# Altium footprint library TeCrea-Misc.PCBLIB: 105 footprints (part 2 of 7)
Each footprint in its own frame and in the unit in brackets; x right, y up, seen from the top. Pads: shape width x height; smd on the part's side, far side on the other; paste and mask are expansions set on the pad; w line width, h text height; cw(c..) or ccw(c..) is an arc to the next point about the centre after c.
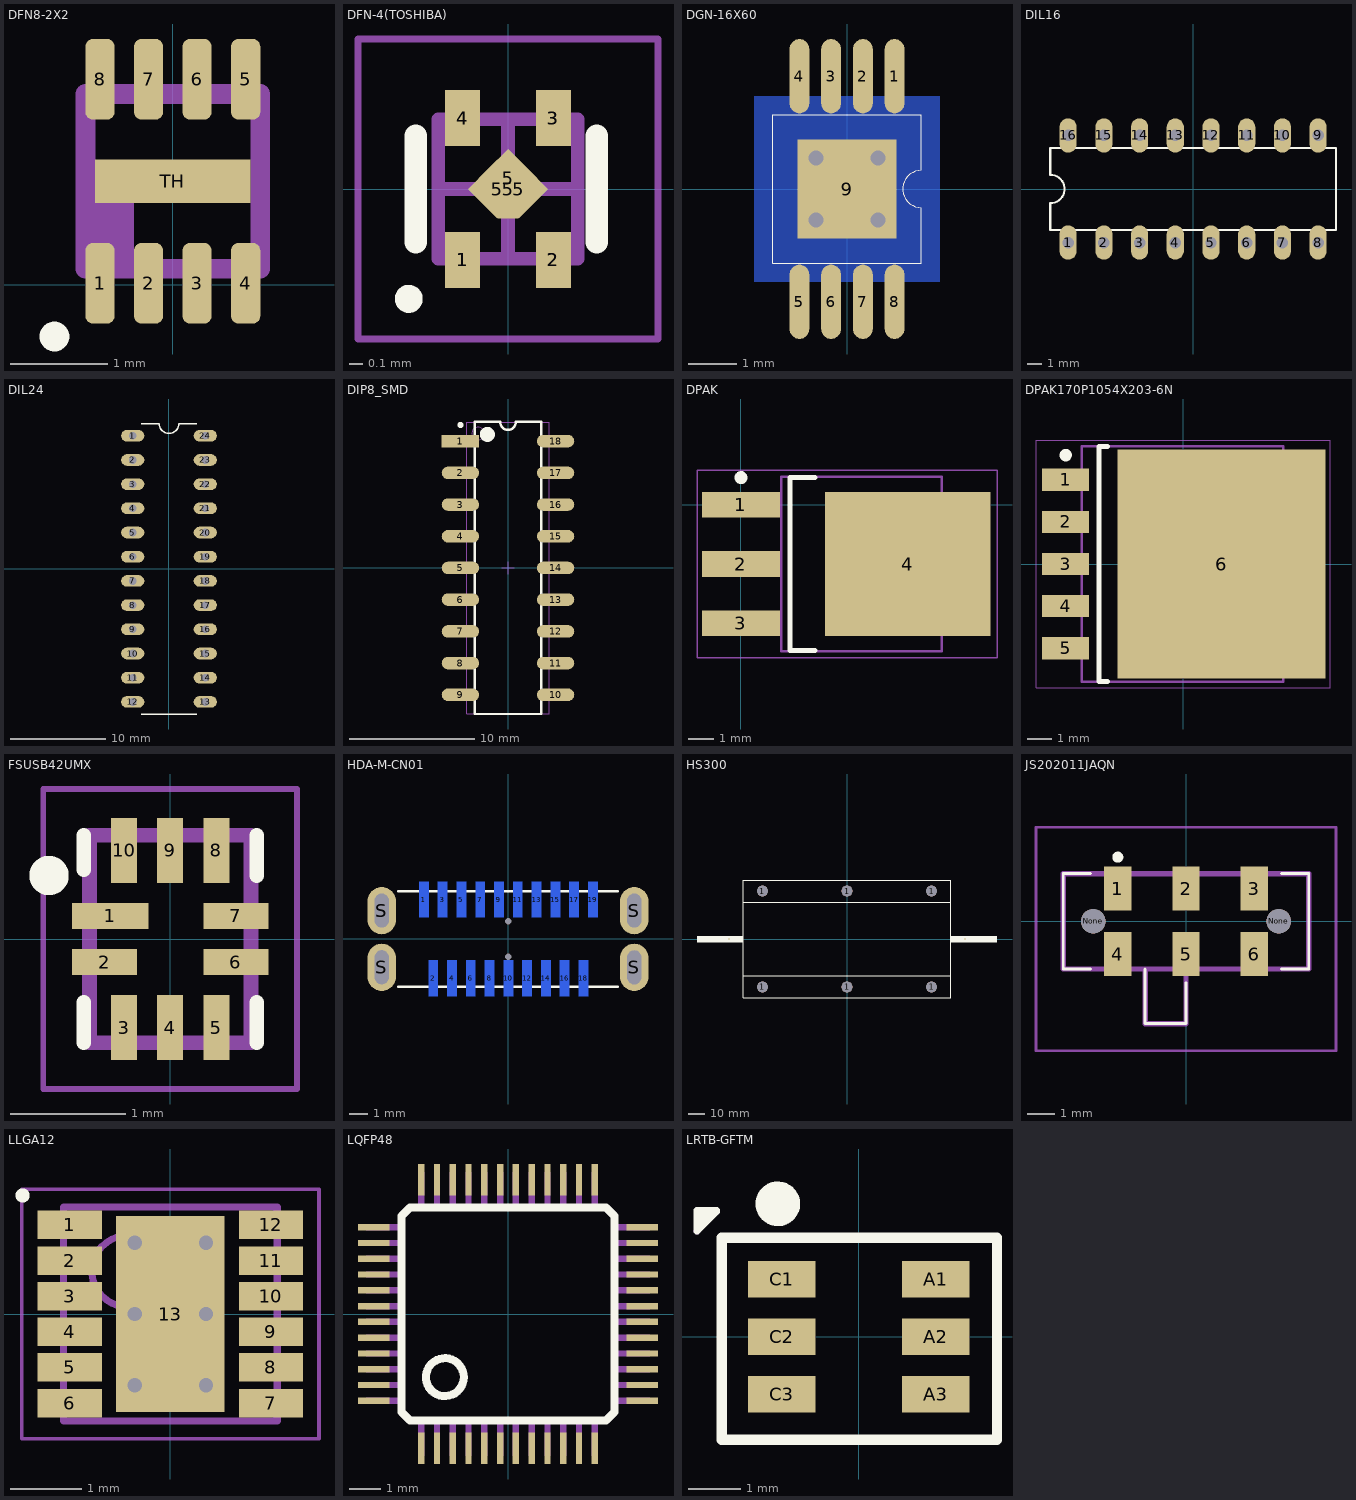
[diagram p1: the footprints below, top view; thin cyan lines are the x and y axes]

## DFN8-2X2 [mm]
pads (9):
  rrect50% 0.3x0.83 smd: 1(-0.75,0.015) 2(-0.25,0.015) 3(0.25,0.015) 4(0.75,0.015) 5(0.75,2.115) 6(0.25,2.115) 7(-0.25,2.115) 8(-0.75,2.115)
  rect 1.6x0.45 smd: TH(0,1.065)
Top Overlay:
  circle w0.254: c-1.219,-0.533 r0.025
Mechanical 16:
  rectangle: -0.85,0.265 -0.4,0.915
  lines w0.203: -0.9,0.165 0.9,0.165 0.9,1.965 -0.9,1.965 -0.9,0.165
3D body: height 0.6, standoff 0, extent -1,0.074 1,2.076
3D body: height 0.15, standoff 0, extent -0.875,0.05 -0.625,0.075
3D body: height 0.15, standoff 0, extent -0.375,0.05 -0.125,0.075
3D body: height 0.15, standoff 0, extent 0.125,0.05 0.375,0.075
3D body: height 0.15, standoff 0, extent 0.625,0.05 0.875,0.075
3D body: height 0.15, standoff 0, extent 0.625,2.075 0.875,2.1
3D body: height 0.15, standoff 0, extent 0.125,2.075 0.375,2.1
3D body: height 0.15, standoff 0, extent -0.375,2.075 -0.125,2.1
3D body: height 0.15, standoff 0, extent -0.875,2.075 -0.625,2.1
3D body: height 0.61, standoff 0, extent -0.774,0.35 -0.575,0.55

## DFN-4(TOSHIBA) [mm] "DFN4 1x1"
pads (12):
  oct 0.25x0.4 smd: 1(-0.325,-0.508) 2(0.325,-0.508) 3(0.325,0.508) 4(-0.325,0.508)
  rect 0.25x0.4 smd: 1(-0.325,-0.508) 2(0.325,-0.508) 3(0.325,0.508) 4(-0.325,0.508)
  rect 0.3x0.3 smd rot 45: 5(-0.076,0) 5(0,0.076) 5(0.076,0)
  oct 0.4x0.4 smd rot 45: 5(0,0)
Top Overlay:
  circle w0.1: c-0.711,-0.787 r0.05
  lines w0.16: -0.661,-0.381 -0.661,0.381 ; 0.635,-0.381 0.635,0.381
Courtyard Top:
  lines w0.05: -1.075,-1.075 -1.075,1.075 1.075,1.075 1.075,-1.075 -1.075,-1.075
  lines w0.1: -0.5,0 0.5,0 ; 0,-0.5 0,0.5
Assembly Top:
  lines w0.1: -0.5,-0.5 -0.5,0.5 0.5,0.5 0.5,-0.5 -0.5,-0.5
3D body "QFN65P100X100X58_HS-5N.step": height 0.58, standoff 0, extent -0.535,-0.5 0.535,0.5

## DGN-16X60 [mil] "DGN-16X60"
pads (9):
  oval 16x60 smd mask+2: 1(38.4,91) 2(12.8,91) 3(-12.8,91) 4(-38.4,91) 5(-38.4,-91) 6(-12.8,-91) 7(12.8,-91) 8(38.4,-91)
  rect 80x80 smd mask+2: 9(0,0)
via 25,-25 diameter 22 hole 12
via -25,-25 diameter 22 hole 12
via -25,25 diameter 22 hole 12
via 25,25 diameter 22 hole 12
Bottom Layer:
  region: 75,-75 75,75 -75,75 -75,-75
Top Overlay:
  lines w1: -60,-60 60,-60 60,-15 cw(c60,0) 60,15 60,60 -60,60 -60,-60
3D body "MSOP8.step": height 45.28, standoff 0, extent -59.06,-96.46 59.06,96.46

## DIL16 [mil]
pads (16):
  oval 48x96 hole 32: 1(-350,-150) 2(-250,-150) 3(-150,-150) 4(-50,-150) 5(50,-150) 6(150,-150) 7(250,-150) 8(350,-150) 9(350,150) 10(250,150) 11(150,150) 12(50,150) 13(-50,150) 14(-150,150) 15(-250,150) 16(-350,150)
Top Overlay:
  lines w6: -400,-115 -400,-40 ccw(c-400,0) -400,40 -400,115 400,115 400,-115 -400,-115
3D body "DIP16.step": height 200.79, standoff -129.92, extent -397.63,-155.91 389.77,153.94

## DIL24 [mil]
pads (24):
  oval 96x48 hole 32: 1(-150,550) 2(-150,450) 3(-150,350) 4(-150,250) 5(-150,150) 6(-150,50) 7(-150,-50) 8(-150,-150) 9(-150,-250) 10(-150,-350) 11(-150,-450) 12(-150,-550) 13(150,-550) 14(150,-450) 15(150,-350) 16(150,-250) 17(150,-150) 18(150,-50) 19(150,50) 20(150,150) 21(150,250) 22(150,350) 23(150,450) 24(150,550)
Top Overlay:
  lines w6: -115,-600 115,-600 ; -115,600 -40,600 ccw(c0,600) 40,600 115,600
3D body "DIP24-300.step": height 200, standoff -98.03, extent -154.92,-635.04 154.93,635.04

## DIP8_SMD [mm] "DIP8 SMD Mount"
pads (18):
  rect 3x1 smd: 1(-3.81,10.16)
  oval 3x1 smd: 2(-3.81,7.62) 3(-3.81,5.08) 4(-3.81,2.54) 5(-3.81,0) 6(-3.81,-2.54) 7(-3.81,-5.08) 8(-3.81,-7.62) 9(-3.81,-10.16) 10(3.81,-10.16) 11(3.81,-7.62) 12(3.81,-5.08) 13(3.81,-2.54) 14(3.81,0) 15(3.81,2.54) 16(3.81,5.08) 17(3.81,7.62) 18(3.81,10.16)
Top Overlay:
  circle w0.25: c-3.81,11.46 r0.125
  circle w0.6: c-1.65,10.7 r0.3
  lines w0.2: -2.65,-11.7 -2.65,11.7 -0.635,11.7 ccw(c0,11.7) 0.635,11.7 2.65,11.7 2.65,-11.7 -2.65,-11.7
Mechanical 13:
  circle w0.1: c-2.4,10.775 r0.5
  lines w0.1: -3.3,-11.675 -3.3,11.675 3.3,11.675 3.3,-11.675 -3.3,-11.675
Mechanical 15:
  lines w0.1: -0.5,0 0.5,0 ; 0,-0.5 0,0.5
3D body: height 5.34, standoff 0.38, extent -3.299,-11.674 3.299,11.674

## DPAK [mm]
height 2.38
pads (4):
  rect 3x1 smd: 1(0,0) 2(0,-2.29) 3(0,-4.58)
  rect 6.4x5.55 smd: 4(6.45,-2.29)
Top Overlay:
  circle w0.25: c0,1.05 r0.125
  lines w0.2: 2.85,-5.64 1.9,-5.64 1.9,1.06 2.85,1.06
Mechanical 13:
  lines w0.1: 1.55,-5.665 1.55,1.085 7.77,1.085 7.77,-5.665 1.55,-5.665
Mechanical 15:
  lines w0.05: -1.7,-5.915 -1.7,1.335 9.9,1.335 9.9,-5.915 -1.7,-5.915
  lines w0.1: 3.6,-2.29 4.6,-2.29 ; 4.1,-2.79 4.1,-1.79
3D body "DPAK.step": height 2.38, standoff 0, extent -0.5,-5.665 9.405,1.085

## DPAK170P1054X203-6N [mm] "S-PAK, 6-Pads, Body 7.17x8.12mm (max), IPC Medium Density"
height 2.03
pads (6):
  rect 1.9x0.9 smd: 1(-4.75,3.4) 2(-4.75,1.7) 3(-4.75,0) 4(-4.75,-1.7) 5(-4.75,-3.4)
  rect 8.4x9.25 smd: 6(1.55,0)
Top Overlay:
  circle w0.25: c-4.75,4.4 r0.125
  lines w0.2: -3.05,-4.75 -3.4,-4.75 -3.4,4.75 -3.05,4.75
Mechanical 13:
  lines w0.1: -4.1,-4.75 4.04,-4.75 4.04,4.75 -4.1,4.75 -4.1,-4.75
Mechanical 15:
  lines w0.05: -5.95,-5 5.95,-5 5.95,5 -5.95,5 -5.95,-5
  lines w0.1: -0.5,0 0.5,0 ; 0,-0.5 0,0.5
3D body "DPAK170P1054X203-6N.step": height 2.16, standoff 0, extent -4.965,-4.75 5.575,4.75

## ensayo qfn-BORRAR [mm]

## FSUSB42UMX [mm]
pads (10):
  rect 0.663x0.225 smd: 1(-0.519,0.2)
  rect 0.563x0.225 smd: 2(-0.569,-0.2) 6(0.569,-0.2) 7(0.569,0.2)
  rect 0.225x0.563 smd: 3(-0.4,-0.768) 4(0,-0.768) 5(0.4,-0.768) 8(0.4,0.768) 9(0,0.768) 10(-0.4,0.768)
Top Overlay:
  circle w0.2: c-1.05,0.55 r0.071
  lines w0.127: -0.75,-0.9 -0.75,-0.55 ; -0.75,0.6 -0.75,0.9 ; 0.75,-0.9 0.75,-0.55 ; 0.75,0.55 0.75,0.9
Mechanical 4:
  lines w0.127: -0.7,-0.9 0.7,-0.9 ; -0.7,-0.9 -0.7,0.9 ; -0.7,-0.9 0.7,-0.9 ; -0.7,-0.9 -0.7,0.9 ; -0.7,0.9 0.7,0.9 ; -0.7,0.9 0.7,0.9 ; 0.7,-0.9 0.7,0.9 ; 0.7,-0.9 0.7,0.9
Mechanical 16:
  lines w0.05: -1.1,-1.3 -1.1,1.3 1.1,1.3 1.1,-1.3 -1.1,-1.3
3D body: height 0.5, standoff 0, extent -0.7,-0.9 0.7,0.9

## HDA-M-CN01 [mm]
pads (25):
  rect 0.5x1.9 smd far side: 1(-4.48,2.094) 2(-3.982,-2.094) 3(-3.48,2.094) 4(-2.982,-2.094) 5(-2.48,2.094) 6(-1.982,-2.094) 7(-1.48,2.094) 8(-0.982,-2.094) 9(-0.48,2.094) 10(0.018,-2.094) 11(0.52,2.094) 12(1.018,-2.094) 13(1.52,2.094) 14(2.018,-2.094) 15(2.52,2.094) 16(3.018,-2.094) 17(3.52,2.094) 18(4.018,-2.094) 19(4.52,2.094)
  round 0 hole 0.35 square unplated: H1(0.016,0.951) H2(0.016,-0.954)
  oval 1.524x2.524 hole 0.762 slot 1.8 at 90 deg: S(-6.725,-1.51) S(-6.725,1.513) S(6.725,-1.51) S(6.725,1.513)
Top Overlay:
  lines w0.15: -5.842,-2.54 5.842,-2.54 ; -5.842,2.54 5.842,2.54
3D body "60S019P-301N-B1.step": height 12.51, standoff -4.49, extent -7.184,-2.475 7.216,2.475

## HS300 [mm]
pads (8):
  rect 1.27x0.635 smd: 1(-72.5,0) 2(72.5,0)
  round 6.6 hole 6.6: 1(-52,-29.5) 1(-52,29.5) 1(0,-29.5) 1(0,29.5) 1(52,-29.5) 1(52,29.5)
Top Overlay:
  rectangle: 63.85,-1.65 92.25,1.55
  rectangle: -92.25,-1.55 -63.85,1.55
  lines w0.127: -92.2,-1.6 -63.85,-1.6 ; -92.2,0 -63.85,0 ; -92.2,1.6 -63.85,1.6 ; 92.2,-1.6 63.85,-1.6 ; 92.2,0 63.85,0 ; 92.2,1.6 63.85,1.6 ; -63.85,-22.75 63.85,-22.75 ; -63.85,-22.75 -63.85,-36.25 63.85,-36.25 63.85,-22.75 ; -63.85,-22.75 -63.85,-1.6 ; -63.85,-1.6 -63.85,0 ; -63.85,0 -63.85,1.6 ; -63.85,1.6 -63.85,22.75 ; -63.85,22.75 63.85,22.75 ; -63.85,22.75 -63.85,36.25 63.85,36.25 63.85,22.75 ; 63.85,-22.75 63.85,-1.6 ; 63.85,-1.6 63.85,0 ; 63.85,0 63.85,1.6 ; 63.85,1.6 63.85,22.75
3D body "User Library-HS300standardResistor.step": height 41.81, standoff 0.01, extent -92.2,-36.25 92.2,36.25

## JS202011JAQN [mm]
pads (8):
  rect 1x1.6 smd: 1(-2.5,1.2) 2(0,1.2) 3(2.5,1.2) 4(-2.5,-1.2) 5(0,-1.2) 6(2.5,-1.2)
  round 0.9 hole 0.9 unplated: None(-3.4,0) None(3.4,0)
Top Overlay:
  lines w0.1: -3.5,-1.75 -4.5,-1.75 -4.5,1.75 -3.5,1.75 ; -1.5,-1.75 -1.5,-3.75 0,-3.75 0,-2.25 ; 3.5,-1.75 4.5,-1.75 4.5,1.75 3.5,1.75
  lines w0.2: -2.6,2.35 ccw(c-2.5,2.35) -2.4,2.35 ccw(c-2.5,2.35) -2.6,2.35
Mechanical 4:
  lines w0.1: -5.5,-4.75 -5.5,3.45 ; -5.5,-4.75 5.5,-4.75 ; -5.5,-4.75 -5.5,3.45 ; -5.5,-4.75 5.5,-4.75 ; -5.5,3.45 5.5,3.45 ; -5.5,3.45 5.5,3.45 ; 5.5,-4.75 5.5,3.45 ; 5.5,-4.75 5.5,3.45
  lines w0.2: -4.5,-1.75 -4.5,1.75 ; -4.5,-1.75 4.5,-1.75 ; -4.5,-1.75 -4.5,1.75 ; -4.5,-1.75 4.5,-1.75 ; -4.5,1.75 4.5,1.75 ; -4.5,1.75 4.5,1.75 ; -1.5,-3.75 -1.5,-1.75 -1.5,-3.75 ; -1.5,-3.75 0,-3.75 ; -1.5,-3.75 0,-3.75 ; 0,-3.75 0,-1.75 0,-3.75 ; 4.5,-1.75 4.5,1.75 ; 4.5,-1.75 4.5,1.75
3D body "js202011jaqn.stp": height 3.61, standoff -0.69, extent -4.5,-3.75 4.5,1.8

## LLGA12 [mm] "LLGA, 12-Leads, Body 3.00x3.00mm, Pitch 0.50mm, Thermal Pad 2.75x1.52mm, IPC Medium Density"
height 0.6
pads (13):
  rect 0.9x0.4 smd: 1(-1.41,1.25) 2(-1.41,0.75) 3(-1.41,0.25) 4(-1.41,-0.25) 5(-1.41,-0.75) 6(-1.41,-1.25) 7(1.41,-1.25) 8(1.41,-0.75) 9(1.41,-0.25) 10(1.41,0.25) 11(1.41,0.75) 12(1.41,1.25)
  rect 1.52x2.75 smd: 13(0,0)
via 0.5,-1 diameter 0.5 hole 0.2
via -0.5,-1 diameter 0.5 hole 0.2
via 0.5,0 diameter 0.5 hole 0.2
via -0.5,0 diameter 0.5 hole 0.2
via 0.5,1 diameter 0.5 hole 0.2
via -0.5,1 diameter 0.5 hole 0.2
Top Overlay:
  circle w0.1: c-2.072,1.662 r0.05
Mechanical 13:
  circle w0.1: c-0.6,0.6 r0.5
  lines w0.1: -1.5,-1.5 1.5,-1.5 1.5,1.5 -1.5,1.5 -1.5,-1.5
Mechanical 15:
  lines w0.05: -2.085,-1.75 2.085,-1.75 2.085,1.75 -2.085,1.75 -2.085,-1.75
  lines w0.1: -0.5,0 0.5,0 ; 0,-0.5 0,0.5
3D body "LLGA12.step": height 0.6, standoff 0, extent -1.58,-1.5 1.58,1.5

## LQFP48 [mm]
pads (48):
  rect 0.2x1 smd: 1(-2.75,-4.25) 2(-2.25,-4.25) 3(-1.75,-4.25) 4(-1.25,-4.25) 5(-0.75,-4.25) 6(-0.25,-4.25) 7(0.25,-4.25) 8(0.75,-4.25) 9(1.25,-4.25) 10(1.75,-4.25) 11(2.25,-4.25) 12(2.75,-4.25) 25(2.75,4.25) 26(2.25,4.25) 27(1.75,4.25) 28(1.25,4.25) 29(0.75,4.25) 30(0.25,4.25) 31(-0.25,4.25) 32(-0.75,4.25) 33(-1.25,4.25) 34(-1.75,4.25) 35(-2.25,4.25) 36(-2.75,4.25)
  rect 1x0.2 smd: 13(4.25,-2.75) 14(4.25,-2.25) 15(4.25,-1.75) 16(4.25,-1.25) 17(4.25,-0.75) 18(4.25,-0.25) 19(4.25,0.25) 20(4.25,0.75) 21(4.25,1.25) 22(4.25,1.75) 23(4.25,2.25) 24(4.25,2.75) 37(-4.25,2.75) 38(-4.25,2.25) 39(-4.25,1.75) 40(-4.25,1.25) 41(-4.25,0.75) 42(-4.25,0.25) 43(-4.25,-0.25) 44(-4.25,-0.75) 45(-4.25,-1.25) 46(-4.25,-1.75) 47(-4.25,-2.25) 48(-4.25,-2.75)
Top Overlay:
  circle w0.254: c-2,-2 r0.6
  lines w0.254: -3.375,-3.1 -3.1,-3.375 3.1,-3.375 3.375,-3.1 3.375,3.1 3.1,3.375 -3.1,3.375 -3.375,3.1 -3.375,-3.1
Mechanical 16:
  rectangle: -2.85,-4.5 -2.65,-3.45
  rectangle: -2.35,-4.5 -2.15,-3.45
  rectangle: -1.85,-4.5 -1.65,-3.45
  rectangle: -1.35,-4.5 -1.15,-3.45
  rectangle: -0.85,-4.5 -0.65,-3.45
  rectangle: -0.35,-4.5 -0.15,-3.45
  rectangle: 0.15,-4.5 0.35,-3.45
  rectangle: 0.65,-4.5 0.85,-3.45
  rectangle: 1.15,-4.5 1.35,-3.45
  rectangle: 1.65,-4.5 1.85,-3.45
  rectangle: 2.15,-4.5 2.35,-3.45
  rectangle: 2.65,-4.5 2.85,-3.45
  rectangle: 3.45,-2.85 4.5,-2.65
  rectangle: 3.45,-2.35 4.5,-2.15
  rectangle: 3.45,-1.85 4.5,-1.65
  rectangle: 3.45,-1.35 4.5,-1.15
  rectangle: 3.45,-0.85 4.5,-0.65
  rectangle: 3.45,-0.35 4.5,-0.15
  rectangle: 3.45,0.15 4.5,0.35
  rectangle: 3.45,0.65 4.5,0.85
  rectangle: 3.45,1.15 4.5,1.35
  rectangle: 3.45,1.65 4.5,1.85
  rectangle: 3.45,2.15 4.5,2.35
  rectangle: 3.45,2.65 4.5,2.85
  rectangle: 2.65,3.45 2.85,4.5
  rectangle: 2.15,3.45 2.35,4.5
  rectangle: 1.65,3.45 1.85,4.5
  rectangle: 1.15,3.45 1.35,4.5
  rectangle: 0.65,3.45 0.85,4.5
  rectangle: 0.15,3.45 0.35,4.5
  rectangle: -0.35,3.45 -0.15,4.5
  rectangle: -0.85,3.45 -0.65,4.5
  rectangle: -1.35,3.45 -1.15,4.5
  rectangle: -1.85,3.45 -1.65,4.5
  rectangle: -2.35,3.45 -2.15,4.5
  rectangle: -2.85,3.45 -2.65,4.5
  rectangle: -4.5,2.65 -3.45,2.85
  rectangle: -4.5,2.15 -3.45,2.35
  rectangle: -4.5,1.65 -3.45,1.85
  rectangle: -4.5,1.15 -3.45,1.35
  rectangle: -4.5,0.65 -3.45,0.85
  rectangle: -4.5,0.15 -3.45,0.35
  rectangle: -4.5,-0.35 -3.45,-0.15
  rectangle: -4.5,-0.85 -3.45,-0.65
  rectangle: -4.5,-1.35 -3.45,-1.15
  rectangle: -4.5,-1.85 -3.45,-1.65
  rectangle: -4.5,-2.35 -3.45,-2.15
  rectangle: -4.5,-2.85 -3.45,-2.65
3D body "User Library-LQFP48_Grid_0_5.STEP": height 1.6, standoff 0, extent -4.5,-4.5 4.5,4.5

## LRTB-GFTM [mm]
pads (6):
  rect 1.3x0.7 smd: A1(1.475,1.1) A2(1.475,0) A3(1.475,-1.1) C1(-1.475,1.1) C2(-1.475,0) C3(-1.475,-1.1)
Top Overlay:
  circle w0.254: c-1.55,2.55 r0.301
  circle w0.254: c-1.55,2.55 r0.112
  lines w0.127: -3.05,2.25 -2.975,2.325 -2.9,2.325 -3.025,2.2 ; -2.725,2.4 -3.1,2.025 -3.1,2.425 -2.725,2.425
  lines w0.2: -2.625,-1.975 -2.625,1.9 2.65,1.9 2.65,-1.975 -2.625,-1.975
Mechanical 1:
  lines w0.127: -3.1,2.025 -3.1,2.025 ; -2.725,2.4 -2.725,2.4
Mechanical 13:
  lines w0.1: -2.625,-1.95 -2.625,1.85 2.65,1.85 2.65,-1.95 -2.625,-1.95
Mechanical 15:
  lines w0.05: -2.625,-1.975 -2.625,1.9 2.625,1.9 2.625,-1.975 -2.625,-1.975
3D body "Lxxx_GFxx_291008_geometry.STEP": height 1.8, standoff -0.02, extent -1.725,-1.65 1.725,1.65